# Altium schematic symbol library jlcpcb_2025_04_resistors_extended_1210.schlib: 2670 symbols (part 7 of 14) (continued)
## CR1210F820KP05Z
designator R?  Resistance: 820kΩ  (hidden comment: *)
Resistor, 820kΩ, ±1%, 500mW, 200V, ±100ppm/℃, -55℃~+155℃, SMD 1210; Manufacturer: Uniroyal; Manufacturer Part Number: CR1210F820KP05Z; Supplier 1: LCSC; Supplier Part Number 1: C147169; JLCPCB Part Number: C147169; Power Rating: 500mW; Category: Resistors; Package Size: 1210; JLCPCB Basic Part: Yes; Tolerance: ±1%; Voltage Rating: 200V; Temperature Coefficient: ±100ppm/℃; Temperature Rating: -55℃~+155℃; ComponentLink1Description: Datasheet; ComponentLink1URL: https://wmsc.lcsc.com/wmsc/upload/file/pdf/v2/lcsc/2304140030_Ever-Ohms-Tech-CR1210F820KP05Z_C147169.pdf; ComponentLink2Description: JLCPCB Part URL; ComponentLink2URL: https://jlcpcb.com/partdetail/C147169
pins: 1, 2
1 alternate drawing of the same symbol

## CR1210F820RP05Z
designator R?  Resistance: 820Ω  (hidden comment: *)
Resistor, 820Ω, ±1%, 500mW, 200V, ±100ppm/℃, -55℃~+155℃, SMD 1210; Manufacturer: Uniroyal; Manufacturer Part Number: CR1210F820RP05Z; Supplier 1: LCSC; Supplier Part Number 1: C165422; JLCPCB Part Number: C165422; Power Rating: 500mW; Category: Resistors; Package Size: 1210; JLCPCB Basic Part: Yes; Tolerance: ±1%; Voltage Rating: 200V; Temperature Coefficient: ±100ppm/℃; Temperature Rating: -55℃~+155℃; ComponentLink1Description: Datasheet; ComponentLink1URL: https://wmsc.lcsc.com/wmsc/upload/file/pdf/v2/lcsc/2304140030_Ever-Ohms-Tech-CR1210F820RP05Z_C165422.pdf; ComponentLink2Description: JLCPCB Part URL; ComponentLink2URL: https://jlcpcb.com/partdetail/C165422
pins: 1, 2
1 alternate drawing of the same symbol

## CR1210F909RP05Z
designator R?  Resistance: 909Ω  (hidden comment: *)
Resistor, 909Ω, ±1%, 500mW, 200V, ±100ppm/℃, -55℃~+155℃, SMD 1210; Manufacturer: Uniroyal; Manufacturer Part Number: CR1210F909RP05Z; Supplier 1: LCSC; Supplier Part Number 1: C174488; JLCPCB Part Number: C174488; Power Rating: 500mW; Category: Resistors; Package Size: 1210; JLCPCB Basic Part: Yes; Tolerance: ±1%; Voltage Rating: 200V; Temperature Coefficient: ±100ppm/℃; Temperature Rating: -55℃~+155℃; ComponentLink1Description: Datasheet; ComponentLink1URL: https://wmsc.lcsc.com/wmsc/upload/file/pdf/v2/lcsc/2304140030_Ever-Ohms-Tech-CR1210F909RP05Z_C174488.pdf; ComponentLink2Description: JLCPCB Part URL; ComponentLink2URL: https://jlcpcb.com/partdetail/C174488
pins: 1, 2
1 alternate drawing of the same symbol

## CR1210F31003G
designator R?  Resistance: 100kΩ  (hidden comment: *)
Resistor, 100kΩ, ±1%, 200V, SMD 1210; Manufacturer: Uniroyal; Manufacturer Part Number: CR1210F31003G; Supplier 1: LCSC; Supplier Part Number 1: C3037464; JLCPCB Part Number: C3037464; Category: Resistors; Package Size: 1210; JLCPCB Basic Part: Yes; Tolerance: ±1%; Voltage Rating: 200V; ComponentLink1Description: Datasheet; ComponentLink1URL: https://wmsc.lcsc.com/wmsc/upload/file/pdf/v2/lcsc/2206222045_LIZ-Elec-CR1210F31003G_C3037464.pdf; ComponentLink2Description: JLCPCB Part URL; ComponentLink2URL: https://jlcpcb.com/partdetail/C3037464
pins: 1, 2
1 alternate drawing of the same symbol

## CR1210F31200G
designator R?  Resistance: 120Ω  (hidden comment: *)
Resistor, 120Ω, ±1%, 200V, SMD 1210; Manufacturer: Uniroyal; Manufacturer Part Number: CR1210F31200G; Supplier 1: LCSC; Supplier Part Number 1: C3036982; JLCPCB Part Number: C3036982; Category: Resistors; Package Size: 1210; JLCPCB Basic Part: Yes; Tolerance: ±1%; Voltage Rating: 200V; ComponentLink1Description: Datasheet; ComponentLink1URL: https://wmsc.lcsc.com/wmsc/upload/file/pdf/v2/lcsc/2206222045_LIZ-Elec-CR1210F31200G_C3036982.pdf; ComponentLink2Description: JLCPCB Part URL; ComponentLink2URL: https://jlcpcb.com/partdetail/C3036982
pins: 1, 2
1 alternate drawing of the same symbol

## CR1210F32490G
designator R?  Resistance: 249Ω  (hidden comment: *)
Resistor, 249Ω, ±1%, 200V, SMD 1210; Manufacturer: Uniroyal; Manufacturer Part Number: CR1210F32490G; Supplier 1: LCSC; Supplier Part Number 1: C3036977; JLCPCB Part Number: C3036977; Category: Resistors; Package Size: 1210; JLCPCB Basic Part: Yes; Tolerance: ±1%; Voltage Rating: 200V; ComponentLink1Description: Datasheet; ComponentLink1URL: https://wmsc.lcsc.com/wmsc/upload/file/pdf/v2/lcsc/2206301715_LIZ-Elec-CR1210F32490G_C3036977.pdf; ComponentLink2Description: JLCPCB Part URL; ComponentLink2URL: https://jlcpcb.com/partdetail/C3036977
pins: 1, 2
1 alternate drawing of the same symbol

## CR1210FR040P05Z
designator R?  Resistance: 40mΩ  (hidden comment: *)
Resistor, 40mΩ, ±1%, 500mW, 200V, -55℃~+155℃, SMD 1210; Manufacturer: Uniroyal; Manufacturer Part Number: CR1210FR040P05Z; Supplier 1: LCSC; Supplier Part Number 1: C165440; JLCPCB Part Number: C165440; Power Rating: 500mW; Category: Resistors; Package Size: 1210; JLCPCB Basic Part: Yes; Tolerance: ±1%; Voltage Rating: 200V; Temperature Rating: -55℃~+155℃; ComponentLink1Description: Datasheet; ComponentLink1URL: https://wmsc.lcsc.com/wmsc/upload/file/pdf/v2/lcsc/2304140030_Ever-Ohms-Tech-CR1210FR040P05Z_C165440.pdf; ComponentLink2Description: JLCPCB Part URL; ComponentLink2URL: https://jlcpcb.com/partdetail/C165440
pins: 1, 2
1 alternate drawing of the same symbol

## CR1210FR062P05R
designator R?  Resistance: 62mΩ  (hidden comment: *)
Resistor, 62mΩ, ±1%, 500mW, 200V, -55℃~+155℃, SMD 1210; Manufacturer: Uniroyal; Manufacturer Part Number: CR1210FR062P05R; Supplier 1: LCSC; Supplier Part Number 1: C165439; JLCPCB Part Number: C165439; Power Rating: 500mW; Category: Resistors; Package Size: 1210; JLCPCB Basic Part: Yes; Tolerance: ±1%; Voltage Rating: 200V; Temperature Rating: -55℃~+155℃; ComponentLink1Description: Datasheet; ComponentLink1URL: https://wmsc.lcsc.com/wmsc/upload/file/pdf/v2/lcsc/2304140030_Ever-Ohms-Tech-CR1210FR062P05R_C165439.pdf; ComponentLink2Description: JLCPCB Part URL; ComponentLink2URL: https://jlcpcb.com/partdetail/C165439
pins: 1, 2
1 alternate drawing of the same symbol

## CR1210FR150P05R
designator R?  Resistance: 150mΩ  (hidden comment: *)
Resistor, 150mΩ, ±1%, 500mW, 200V, -55℃~+155℃, SMD 1210; Manufacturer: Uniroyal; Manufacturer Part Number: CR1210FR150P05R; Supplier 1: LCSC; Supplier Part Number 1: C165438; JLCPCB Part Number: C165438; Power Rating: 500mW; Category: Resistors; Package Size: 1210; JLCPCB Basic Part: Yes; Tolerance: ±1%; Voltage Rating: 200V; Temperature Rating: -55℃~+155℃; ComponentLink1Description: Datasheet; ComponentLink1URL: https://wmsc.lcsc.com/wmsc/upload/file/pdf/v2/lcsc/2304140030_Ever-Ohms-Tech-CR1210FR150P05R_C165438.pdf; ComponentLink2Description: JLCPCB Part URL; ComponentLink2URL: https://jlcpcb.com/partdetail/C165438
pins: 1, 2
1 alternate drawing of the same symbol

## CR1210FR430P05R
designator R?  Resistance: 430mΩ  (hidden comment: *)
Resistor, 430mΩ, ±1%, 500mW, 200V, -55℃~+155℃, SMD 1210; Manufacturer: Uniroyal; Manufacturer Part Number: CR1210FR430P05R; Supplier 1: LCSC; Supplier Part Number 1: C165435; JLCPCB Part Number: C165435; Power Rating: 500mW; Category: Resistors; Package Size: 1210; JLCPCB Basic Part: Yes; Tolerance: ±1%; Voltage Rating: 200V; Temperature Rating: -55℃~+155℃; ComponentLink1Description: Datasheet; ComponentLink1URL: https://wmsc.lcsc.com/wmsc/upload/file/pdf/v2/lcsc/2304140030_Ever-Ohms-Tech-CR1210FR430P05R_C165435.pdf; ComponentLink2Description: JLCPCB Part URL; ComponentLink2URL: https://jlcpcb.com/partdetail/C165435
pins: 1, 2
1 alternate drawing of the same symbol

## CR1210FR680P05R
designator R?  Resistance: 680mΩ  (hidden comment: *)
Resistor, 680mΩ, ±1%, 500mW, 200V, -55℃~+155℃, SMD 1210; Manufacturer: Uniroyal; Manufacturer Part Number: CR1210FR680P05R; Supplier 1: LCSC; Supplier Part Number 1: C165433; JLCPCB Part Number: C165433; Power Rating: 500mW; Category: Resistors; Package Size: 1210; JLCPCB Basic Part: Yes; Tolerance: ±1%; Voltage Rating: 200V; Temperature Rating: -55℃~+155℃; ComponentLink1Description: Datasheet; ComponentLink1URL: https://wmsc.lcsc.com/wmsc/upload/file/pdf/v2/lcsc/2304140030_Ever-Ohms-Tech-CR1210FR680P05R_C165433.pdf; ComponentLink2Description: JLCPCB Part URL; ComponentLink2URL: https://jlcpcb.com/partdetail/C165433
pins: 1, 2
1 alternate drawing of the same symbol

## CR1210FR820P05R
designator R?  Resistance: 820mΩ  (hidden comment: *)
Resistor, 820mΩ, ±1%, 500mW, 200V, -55℃~+155℃, SMD 1210; Manufacturer: Uniroyal; Manufacturer Part Number: CR1210FR820P05R; Supplier 1: LCSC; Supplier Part Number 1: C165432; JLCPCB Part Number: C165432; Power Rating: 500mW; Category: Resistors; Package Size: 1210; JLCPCB Basic Part: Yes; Tolerance: ±1%; Voltage Rating: 200V; Temperature Rating: -55℃~+155℃; ComponentLink1Description: Datasheet; ComponentLink1URL: https://wmsc.lcsc.com/wmsc/upload/file/pdf/v2/lcsc/2304140030_Ever-Ohms-Tech-CR1210FR820P05R_C165432.pdf; ComponentLink2Description: JLCPCB Part URL; ComponentLink2URL: https://jlcpcb.com/partdetail/C165432
pins: 1, 2
1 alternate drawing of the same symbol

## CR1210J0R00P05Z
designator R?  Resistance: 0Ω  (hidden comment: *)
Resistor, 0Ω, ±5%, 500mW, 200V, -55℃~+155℃, SMD 1210; Manufacturer: Uniroyal; Manufacturer Part Number: CR1210J0R00P05Z; Supplier 1: LCSC; Supplier Part Number 1: C149726; JLCPCB Part Number: C149726; Power Rating: 500mW; Category: Resistors; Package Size: 1210; JLCPCB Basic Part: Yes; Tolerance: ±5%; Voltage Rating: 200V; Temperature Rating: -55℃~+155℃; ComponentLink1Description: Datasheet; ComponentLink1URL: https://wmsc.lcsc.com/wmsc/upload/file/pdf/v2/lcsc/2304140030_Ever-Ohms-Tech-CR1210J0R00P05Z_C149726.pdf; ComponentLink2Description: JLCPCB Part URL; ComponentLink2URL: https://jlcpcb.com/partdetail/C149726
pins: 1, 2
1 alternate drawing of the same symbol

## CR1210J0R36P05
designator R?  Resistance: 360mΩ  (hidden comment: *)
Resistor, 360mΩ, ±5%, 500mW, 200V, ±600ppm/℃, -55℃~+155℃, SMD 1210; Manufacturer: Uniroyal; Manufacturer Part Number: CR1210J0R36P05; Supplier 1: LCSC; Supplier Part Number 1: C429672; JLCPCB Part Number: C429672; Power Rating: 500mW; Category: Resistors; Package Size: 1210; JLCPCB Basic Part: Yes; Tolerance: ±5%; Voltage Rating: 200V; Temperature Coefficient: ±600ppm/℃; Temperature Rating: -55℃~+155℃; ComponentLink1Description: Datasheet; ComponentLink1URL: https://wmsc.lcsc.com/wmsc/upload/file/pdf/v2/lcsc/2304140030_Ever-Ohms-Tech-CR1210J0R36P05_C429672.pdf; ComponentLink2Description: JLCPCB Part URL; ComponentLink2URL: https://jlcpcb.com/partdetail/C429672
pins: 1, 2
1 alternate drawing of the same symbol

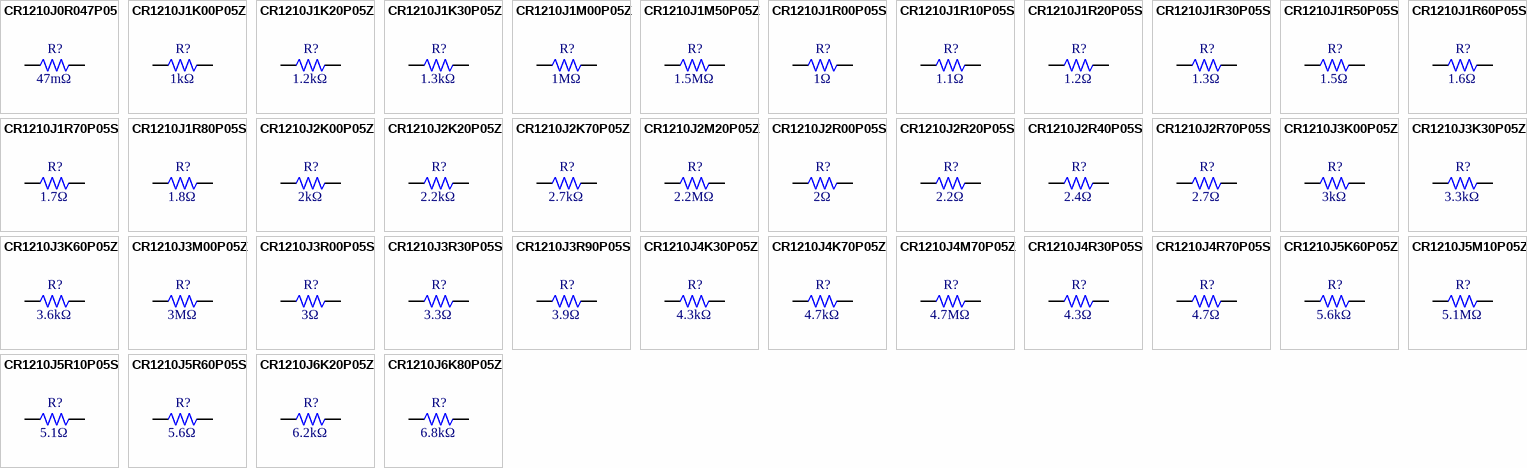
[diagram p33: symbols CR1210J0R047P05 to CR1210J6K80P05Z]

## CR1210J0R047P05
designator R?  Resistance: 47mΩ  (hidden comment: *)
Resistor, 47mΩ, ±5%, 500mW, 200V, -55℃~+155℃, SMD 1210; Manufacturer: Uniroyal; Manufacturer Part Number: CR1210J0R047P05; Supplier 1: LCSC; Supplier Part Number 1: C429545; JLCPCB Part Number: C429545; Power Rating: 500mW; Category: Resistors; Package Size: 1210; JLCPCB Basic Part: Yes; Tolerance: ±5%; Voltage Rating: 200V; Temperature Rating: -55℃~+155℃; ComponentLink1Description: Datasheet; ComponentLink1URL: https://wmsc.lcsc.com/wmsc/upload/file/pdf/v2/lcsc/2304140030_Ever-Ohms-Tech-CR1210J0R047P05_C429545.pdf; ComponentLink2Description: JLCPCB Part URL; ComponentLink2URL: https://jlcpcb.com/partdetail/C429545
pins: 1, 2
1 alternate drawing of the same symbol

## CR1210J1K00P05Z
designator R?  Resistance: 1kΩ  (hidden comment: *)
Resistor, 1kΩ, ±5%, 500mW, 200V, ±100ppm/℃, -55℃~+155℃, SMD 1210; Manufacturer: Uniroyal; Manufacturer Part Number: CR1210J1K00P05Z; Supplier 1: LCSC; Supplier Part Number 1: C149743; JLCPCB Part Number: C149743; Power Rating: 500mW; Category: Resistors; Package Size: 1210; JLCPCB Basic Part: Yes; Tolerance: ±5%; Voltage Rating: 200V; Temperature Coefficient: ±100ppm/℃; Temperature Rating: -55℃~+155℃; ComponentLink1Description: Datasheet; ComponentLink1URL: https://wmsc.lcsc.com/wmsc/upload/file/pdf/v2/lcsc/2304140030_Ever-Ohms-Tech-CR1210J1K00P05Z_C149743.pdf; ComponentLink2Description: JLCPCB Part URL; ComponentLink2URL: https://jlcpcb.com/partdetail/C149743
pins: 1, 2
1 alternate drawing of the same symbol

## CR1210J1K20P05Z
designator R?  Resistance: 1.2kΩ  (hidden comment: *)
Resistor, 1.2kΩ, ±5%, 500mW, 200V, ±100ppm/℃, -55℃~+155℃, SMD 1210; Manufacturer: Uniroyal; Manufacturer Part Number: CR1210J1K20P05Z; Supplier 1: LCSC; Supplier Part Number 1: C149740; JLCPCB Part Number: C149740; Power Rating: 500mW; Category: Resistors; Package Size: 1210; JLCPCB Basic Part: Yes; Tolerance: ±5%; Voltage Rating: 200V; Temperature Coefficient: ±100ppm/℃; Temperature Rating: -55℃~+155℃; ComponentLink1Description: Datasheet; ComponentLink1URL: https://wmsc.lcsc.com/wmsc/upload/file/pdf/v2/lcsc/2304140030_Ever-Ohms-Tech-CR1210J1K20P05Z_C149740.pdf; ComponentLink2Description: JLCPCB Part URL; ComponentLink2URL: https://jlcpcb.com/partdetail/C149740
pins: 1, 2
1 alternate drawing of the same symbol

## CR1210J1K30P05Z
designator R?  Resistance: 1.3kΩ  (hidden comment: *)
Resistor, 1.3kΩ, ±5%, 500mW, 200V, ±100ppm/℃, -55℃~+155℃, SMD 1210; Manufacturer: Uniroyal; Manufacturer Part Number: CR1210J1K30P05Z; Supplier 1: LCSC; Supplier Part Number 1: C174627; JLCPCB Part Number: C174627; Power Rating: 500mW; Category: Resistors; Package Size: 1210; JLCPCB Basic Part: Yes; Tolerance: ±5%; Voltage Rating: 200V; Temperature Coefficient: ±100ppm/℃; Temperature Rating: -55℃~+155℃; ComponentLink1Description: Datasheet; ComponentLink1URL: https://wmsc.lcsc.com/wmsc/upload/file/pdf/v2/lcsc/2304140030_Ever-Ohms-Tech-CR1210J1K30P05Z_C174627.pdf; ComponentLink2Description: JLCPCB Part URL; ComponentLink2URL: https://jlcpcb.com/partdetail/C174627
pins: 1, 2
1 alternate drawing of the same symbol

## CR1210J1M00P05Z
designator R?  Resistance: 1MΩ  (hidden comment: *)
Resistor, 1MΩ, ±5%, 500mW, 200V, ±100ppm/℃, -55℃~+155℃, SMD 1210; Manufacturer: Uniroyal; Manufacturer Part Number: CR1210J1M00P05Z; Supplier 1: LCSC; Supplier Part Number 1: C149747; JLCPCB Part Number: C149747; Power Rating: 500mW; Category: Resistors; Package Size: 1210; JLCPCB Basic Part: Yes; Tolerance: ±5%; Voltage Rating: 200V; Temperature Coefficient: ±100ppm/℃; Temperature Rating: -55℃~+155℃; ComponentLink1Description: Datasheet; ComponentLink1URL: https://wmsc.lcsc.com/wmsc/upload/file/pdf/v2/lcsc/2304140030_Ever-Ohms-Tech-CR1210J1M00P05Z_C149747.pdf; ComponentLink2Description: JLCPCB Part URL; ComponentLink2URL: https://jlcpcb.com/partdetail/C149747
pins: 1, 2
1 alternate drawing of the same symbol

## CR1210J1M50P05Z
designator R?  Resistance: 1.5MΩ  (hidden comment: *)
Resistor, 1.5MΩ, ±5%, 500mW, 200V, ±100ppm/℃, -55℃~+155℃, SMD 1210; Manufacturer: Uniroyal; Manufacturer Part Number: CR1210J1M50P05Z; Supplier 1: LCSC; Supplier Part Number 1: C149745; JLCPCB Part Number: C149745; Power Rating: 500mW; Category: Resistors; Package Size: 1210; JLCPCB Basic Part: Yes; Tolerance: ±5%; Voltage Rating: 200V; Temperature Coefficient: ±100ppm/℃; Temperature Rating: -55℃~+155℃; ComponentLink1Description: Datasheet; ComponentLink1URL: https://wmsc.lcsc.com/wmsc/upload/file/pdf/v2/lcsc/2304140030_Ever-Ohms-Tech-CR1210J1M50P05Z_C149745.pdf; ComponentLink2Description: JLCPCB Part URL; ComponentLink2URL: https://jlcpcb.com/partdetail/C149745
pins: 1, 2
1 alternate drawing of the same symbol

## CR1210J1R00P05S
designator R?  Resistance: 1Ω  (hidden comment: *)
Resistor, 1Ω, ±5%, 500mW, 200V, ±300ppm/℃, -55℃~+155℃, SMD 1210; Manufacturer: Uniroyal; Manufacturer Part Number: CR1210J1R00P05S; Supplier 1: LCSC; Supplier Part Number 1: C429437; JLCPCB Part Number: C429437; Power Rating: 500mW; Category: Resistors; Package Size: 1210; JLCPCB Basic Part: Yes; Tolerance: ±5%; Voltage Rating: 200V; Temperature Coefficient: ±300ppm/℃; Temperature Rating: -55℃~+155℃; ComponentLink1Description: Datasheet; ComponentLink1URL: https://wmsc.lcsc.com/wmsc/upload/file/pdf/v2/lcsc/2304140030_Ever-Ohms-Tech-CR1210J1R00P05S_C429437.pdf; ComponentLink2Description: JLCPCB Part URL; ComponentLink2URL: https://jlcpcb.com/partdetail/C429437
pins: 1, 2
1 alternate drawing of the same symbol

## CR1210J1R10P05S
designator R?  Resistance: 1.1Ω  (hidden comment: *)
Resistor, 1.1Ω, ±5%, 500mW, 200V, ±400ppm/℃, -55℃~+155℃, SMD 1210; Manufacturer: Uniroyal; Manufacturer Part Number: CR1210J1R10P05S; Supplier 1: LCSC; Supplier Part Number 1: C149748; JLCPCB Part Number: C149748; Power Rating: 500mW; Category: Resistors; Package Size: 1210; JLCPCB Basic Part: Yes; Tolerance: ±5%; Voltage Rating: 200V; Temperature Coefficient: ±400ppm/℃; Temperature Rating: -55℃~+155℃; ComponentLink1Description: Datasheet; ComponentLink1URL: https://wmsc.lcsc.com/wmsc/upload/file/pdf/v2/lcsc/2304140030_Ever-Ohms-Tech-CR1210J1R10P05S_C149748.pdf; ComponentLink2Description: JLCPCB Part URL; ComponentLink2URL: https://jlcpcb.com/partdetail/C149748
pins: 1, 2
1 alternate drawing of the same symbol

## CR1210J1R20P05S
designator R?  Resistance: 1.2Ω  (hidden comment: *)
Resistor, 1.2Ω, ±5%, 500mW, 200V, ±400ppm/℃, -55℃~+155℃, SMD 1210; Manufacturer: Uniroyal; Manufacturer Part Number: CR1210J1R20P05S; Supplier 1: LCSC; Supplier Part Number 1: C174569; JLCPCB Part Number: C174569; Power Rating: 500mW; Category: Resistors; Package Size: 1210; JLCPCB Basic Part: Yes; Tolerance: ±5%; Voltage Rating: 200V; Temperature Coefficient: ±400ppm/℃; Temperature Rating: -55℃~+155℃; ComponentLink1Description: Datasheet; ComponentLink1URL: https://wmsc.lcsc.com/wmsc/upload/file/pdf/v2/lcsc/2304140030_Ever-Ohms-Tech-CR1210J1R20P05S_C174569.pdf; ComponentLink2Description: JLCPCB Part URL; ComponentLink2URL: https://jlcpcb.com/partdetail/C174569
pins: 1, 2
1 alternate drawing of the same symbol

## CR1210J1R30P05S
designator R?  Resistance: 1.3Ω  (hidden comment: *)
Resistor, 1.3Ω, ±5%, 500mW, 200V, ±400ppm/℃, -55℃~+155℃, SMD 1210; Manufacturer: Uniroyal; Manufacturer Part Number: CR1210J1R30P05S; Supplier 1: LCSC; Supplier Part Number 1: C174570; JLCPCB Part Number: C174570; Power Rating: 500mW; Category: Resistors; Package Size: 1210; JLCPCB Basic Part: Yes; Tolerance: ±5%; Voltage Rating: 200V; Temperature Coefficient: ±400ppm/℃; Temperature Rating: -55℃~+155℃; ComponentLink1Description: Datasheet; ComponentLink1URL: https://wmsc.lcsc.com/wmsc/upload/file/pdf/v2/lcsc/2304140030_Ever-Ohms-Tech-CR1210J1R30P05S_C174570.pdf; ComponentLink2Description: JLCPCB Part URL; ComponentLink2URL: https://jlcpcb.com/partdetail/C174570
pins: 1, 2
1 alternate drawing of the same symbol

## CR1210J1R50P05S
designator R?  Resistance: 1.5Ω  (hidden comment: *)
Resistor, 1.5Ω, ±5%, 500mW, 200V, ±400ppm/℃, -55℃~+155℃, SMD 1210; Manufacturer: Uniroyal; Manufacturer Part Number: CR1210J1R50P05S; Supplier 1: LCSC; Supplier Part Number 1: C149749; JLCPCB Part Number: C149749; Power Rating: 500mW; Category: Resistors; Package Size: 1210; JLCPCB Basic Part: Yes; Tolerance: ±5%; Voltage Rating: 200V; Temperature Coefficient: ±400ppm/℃; Temperature Rating: -55℃~+155℃; ComponentLink1Description: Datasheet; ComponentLink1URL: https://wmsc.lcsc.com/wmsc/upload/file/pdf/v2/lcsc/2304140030_Ever-Ohms-Tech-CR1210J1R50P05S_C149749.pdf; ComponentLink2Description: JLCPCB Part URL; ComponentLink2URL: https://jlcpcb.com/partdetail/C149749
pins: 1, 2
1 alternate drawing of the same symbol

## CR1210J1R60P05S
designator R?  Resistance: 1.6Ω  (hidden comment: *)
Resistor, 1.6Ω, ±5%, 500mW, 200V, ±400ppm/℃, -55℃~+155℃, SMD 1210; Manufacturer: Uniroyal; Manufacturer Part Number: CR1210J1R60P05S; Supplier 1: LCSC; Supplier Part Number 1: C174571; JLCPCB Part Number: C174571; Power Rating: 500mW; Category: Resistors; Package Size: 1210; JLCPCB Basic Part: Yes; Tolerance: ±5%; Voltage Rating: 200V; Temperature Coefficient: ±400ppm/℃; Temperature Rating: -55℃~+155℃; ComponentLink1Description: Datasheet; ComponentLink1URL: https://wmsc.lcsc.com/wmsc/upload/file/pdf/v2/lcsc/2304140030_Ever-Ohms-Tech-CR1210J1R60P05S_C174571.pdf; ComponentLink2Description: JLCPCB Part URL; ComponentLink2URL: https://jlcpcb.com/partdetail/C174571
pins: 1, 2
1 alternate drawing of the same symbol

## CR1210J1R70P05S
designator R?  Resistance: 1.7Ω  (hidden comment: *)
Resistor, 1.7Ω, ±5%, 500mW, 200V, ±400ppm/℃, -55℃~+155℃, SMD 1210; Manufacturer: Uniroyal; Manufacturer Part Number: CR1210J1R70P05S; Supplier 1: LCSC; Supplier Part Number 1: C174572; JLCPCB Part Number: C174572; Power Rating: 500mW; Category: Resistors; Package Size: 1210; JLCPCB Basic Part: Yes; Tolerance: ±5%; Voltage Rating: 200V; Temperature Coefficient: ±400ppm/℃; Temperature Rating: -55℃~+155℃; ComponentLink1Description: Datasheet; ComponentLink1URL: https://wmsc.lcsc.com/wmsc/upload/file/pdf/v2/lcsc/2304140030_Ever-Ohms-Tech-CR1210J1R70P05S_C174572.pdf; ComponentLink2Description: JLCPCB Part URL; ComponentLink2URL: https://jlcpcb.com/partdetail/C174572
pins: 1, 2
1 alternate drawing of the same symbol

## CR1210J1R80P05S
designator R?  Resistance: 1.8Ω  (hidden comment: *)
Resistor, 1.8Ω, ±5%, 500mW, 200V, ±400ppm/℃, -55℃~+155℃, SMD 1210; Manufacturer: Uniroyal; Manufacturer Part Number: CR1210J1R80P05S; Supplier 1: LCSC; Supplier Part Number 1: C149750; JLCPCB Part Number: C149750; Power Rating: 500mW; Category: Resistors; Package Size: 1210; JLCPCB Basic Part: Yes; Tolerance: ±5%; Voltage Rating: 200V; Temperature Coefficient: ±400ppm/℃; Temperature Rating: -55℃~+155℃; ComponentLink1Description: Datasheet; ComponentLink1URL: https://wmsc.lcsc.com/wmsc/upload/file/pdf/v2/lcsc/2304140030_Ever-Ohms-Tech-CR1210J1R80P05S_C149750.pdf; ComponentLink2Description: JLCPCB Part URL; ComponentLink2URL: https://jlcpcb.com/partdetail/C149750
pins: 1, 2
1 alternate drawing of the same symbol

## CR1210J2K00P05Z
designator R?  Resistance: 2kΩ  (hidden comment: *)
Resistor, 2kΩ, ±5%, 500mW, 200V, ±100ppm/℃, -55℃~+155℃, SMD 1210; Manufacturer: Uniroyal; Manufacturer Part Number: CR1210J2K00P05Z; Supplier 1: LCSC; Supplier Part Number 1: C149764; JLCPCB Part Number: C149764; Power Rating: 500mW; Category: Resistors; Package Size: 1210; JLCPCB Basic Part: Yes; Tolerance: ±5%; Voltage Rating: 200V; Temperature Coefficient: ±100ppm/℃; Temperature Rating: -55℃~+155℃; ComponentLink1Description: Datasheet; ComponentLink1URL: https://wmsc.lcsc.com/wmsc/upload/file/pdf/v2/lcsc/2304140030_Ever-Ohms-Tech-CR1210J2K00P05Z_C149764.pdf; ComponentLink2Description: JLCPCB Part URL; ComponentLink2URL: https://jlcpcb.com/partdetail/C149764
pins: 1, 2
1 alternate drawing of the same symbol

## CR1210J2K20P05Z
designator R?  Resistance: 2.2kΩ  (hidden comment: *)
Resistor, 2.2kΩ, ±5%, 500mW, 200V, ±100ppm/℃, -55℃~+155℃, SMD 1210; Manufacturer: Uniroyal; Manufacturer Part Number: CR1210J2K20P05Z; Supplier 1: LCSC; Supplier Part Number 1: C149762; JLCPCB Part Number: C149762; Power Rating: 500mW; Category: Resistors; Package Size: 1210; JLCPCB Basic Part: Yes; Tolerance: ±5%; Voltage Rating: 200V; Temperature Coefficient: ±100ppm/℃; Temperature Rating: -55℃~+155℃; ComponentLink1Description: Datasheet; ComponentLink1URL: https://wmsc.lcsc.com/wmsc/upload/file/pdf/v2/lcsc/2304140030_Ever-Ohms-Tech-CR1210J2K20P05Z_C149762.pdf; ComponentLink2Description: JLCPCB Part URL; ComponentLink2URL: https://jlcpcb.com/partdetail/C149762
pins: 1, 2
1 alternate drawing of the same symbol

## CR1210J2K70P05Z
designator R?  Resistance: 2.7kΩ  (hidden comment: *)
Resistor, 2.7kΩ, ±5%, 500mW, 200V, ±100ppm/℃, -55℃~+155℃, SMD 1210; Manufacturer: Uniroyal; Manufacturer Part Number: CR1210J2K70P05Z; Supplier 1: LCSC; Supplier Part Number 1: C149763; JLCPCB Part Number: C149763; Power Rating: 500mW; Category: Resistors; Package Size: 1210; JLCPCB Basic Part: Yes; Tolerance: ±5%; Voltage Rating: 200V; Temperature Coefficient: ±100ppm/℃; Temperature Rating: -55℃~+155℃; ComponentLink1Description: Datasheet; ComponentLink1URL: https://wmsc.lcsc.com/wmsc/upload/file/pdf/v2/lcsc/2304140030_Ever-Ohms-Tech-CR1210J2K70P05Z_C149763.pdf; ComponentLink2Description: JLCPCB Part URL; ComponentLink2URL: https://jlcpcb.com/partdetail/C149763
pins: 1, 2
1 alternate drawing of the same symbol

## CR1210J2M20P05Z
designator R?  Resistance: 2.2MΩ  (hidden comment: *)
Resistor, 2.2MΩ, ±5%, 500mW, 200V, ±100ppm/℃, -55℃~+155℃, SMD 1210; Manufacturer: Uniroyal; Manufacturer Part Number: CR1210J2M20P05Z; Supplier 1: LCSC; Supplier Part Number 1: C149765; JLCPCB Part Number: C149765; Power Rating: 500mW; Category: Resistors; Package Size: 1210; JLCPCB Basic Part: Yes; Tolerance: ±5%; Voltage Rating: 200V; Temperature Coefficient: ±100ppm/℃; Temperature Rating: -55℃~+155℃; ComponentLink1Description: Datasheet; ComponentLink1URL: https://wmsc.lcsc.com/wmsc/upload/file/pdf/v2/lcsc/2304140030_Ever-Ohms-Tech-CR1210J2M20P05Z_C149765.pdf; ComponentLink2Description: JLCPCB Part URL; ComponentLink2URL: https://jlcpcb.com/partdetail/C149765
pins: 1, 2
1 alternate drawing of the same symbol

## CR1210J2R00P05S
designator R?  Resistance: 2Ω  (hidden comment: *)
Resistor, 2Ω, ±5%, 500mW, 200V, ±400ppm/℃, -55℃~+155℃, SMD 1210; Manufacturer: Uniroyal; Manufacturer Part Number: CR1210J2R00P05S; Supplier 1: LCSC; Supplier Part Number 1: C174574; JLCPCB Part Number: C174574; Power Rating: 500mW; Category: Resistors; Package Size: 1210; JLCPCB Basic Part: Yes; Tolerance: ±5%; Voltage Rating: 200V; Temperature Coefficient: ±400ppm/℃; Temperature Rating: -55℃~+155℃; ComponentLink1Description: Datasheet; ComponentLink1URL: https://wmsc.lcsc.com/wmsc/upload/file/pdf/v2/lcsc/2304140030_Ever-Ohms-Tech-CR1210J2R00P05S_C174574.pdf; ComponentLink2Description: JLCPCB Part URL; ComponentLink2URL: https://jlcpcb.com/partdetail/C174574
pins: 1, 2
1 alternate drawing of the same symbol

## CR1210J2R20P05S
designator R?  Resistance: 2.2Ω  (hidden comment: *)
Resistor, 2.2Ω, ±5%, 500mW, 200V, ±400ppm/℃, -55℃~+155℃, SMD 1210; Manufacturer: Uniroyal; Manufacturer Part Number: CR1210J2R20P05S; Supplier 1: LCSC; Supplier Part Number 1: C149767; JLCPCB Part Number: C149767; Power Rating: 500mW; Category: Resistors; Package Size: 1210; JLCPCB Basic Part: Yes; Tolerance: ±5%; Voltage Rating: 200V; Temperature Coefficient: ±400ppm/℃; Temperature Rating: -55℃~+155℃; ComponentLink1Description: Datasheet; ComponentLink1URL: https://wmsc.lcsc.com/wmsc/upload/file/pdf/v2/lcsc/2304140030_Ever-Ohms-Tech-CR1210J2R20P05S_C149767.pdf; ComponentLink2Description: JLCPCB Part URL; ComponentLink2URL: https://jlcpcb.com/partdetail/C149767
pins: 1, 2
1 alternate drawing of the same symbol

## CR1210J2R40P05S
designator R?  Resistance: 2.4Ω  (hidden comment: *)
Resistor, 2.4Ω, ±5%, 500mW, 200V, ±400ppm/℃, -55℃~+155℃, SMD 1210; Manufacturer: Uniroyal; Manufacturer Part Number: CR1210J2R40P05S; Supplier 1: LCSC; Supplier Part Number 1: C174575; JLCPCB Part Number: C174575; Power Rating: 500mW; Category: Resistors; Package Size: 1210; JLCPCB Basic Part: Yes; Tolerance: ±5%; Voltage Rating: 200V; Temperature Coefficient: ±400ppm/℃; Temperature Rating: -55℃~+155℃; ComponentLink1Description: Datasheet; ComponentLink1URL: https://wmsc.lcsc.com/wmsc/upload/file/pdf/v2/lcsc/2304140030_Ever-Ohms-Tech-CR1210J2R40P05S_C174575.pdf; ComponentLink2Description: JLCPCB Part URL; ComponentLink2URL: https://jlcpcb.com/partdetail/C174575
pins: 1, 2
1 alternate drawing of the same symbol

## CR1210J2R70P05S
designator R?  Resistance: 2.7Ω  (hidden comment: *)
Resistor, 2.7Ω, ±5%, 500mW, 200V, ±400ppm/℃, -55℃~+155℃, SMD 1210; Manufacturer: Uniroyal; Manufacturer Part Number: CR1210J2R70P05S; Supplier 1: LCSC; Supplier Part Number 1: C149768; JLCPCB Part Number: C149768; Power Rating: 500mW; Category: Resistors; Package Size: 1210; JLCPCB Basic Part: Yes; Tolerance: ±5%; Voltage Rating: 200V; Temperature Coefficient: ±400ppm/℃; Temperature Rating: -55℃~+155℃; ComponentLink1Description: Datasheet; ComponentLink1URL: https://wmsc.lcsc.com/wmsc/upload/file/pdf/v2/lcsc/2304140030_Ever-Ohms-Tech-CR1210J2R70P05S_C149768.pdf; ComponentLink2Description: JLCPCB Part URL; ComponentLink2URL: https://jlcpcb.com/partdetail/C149768
pins: 1, 2
1 alternate drawing of the same symbol

## CR1210J3K00P05Z
designator R?  Resistance: 3kΩ  (hidden comment: *)
Resistor, 3kΩ, ±5%, 500mW, 200V, ±100ppm/℃, -55℃~+155℃, SMD 1210; Manufacturer: Uniroyal; Manufacturer Part Number: CR1210J3K00P05Z; Supplier 1: LCSC; Supplier Part Number 1: C174632; JLCPCB Part Number: C174632; Power Rating: 500mW; Category: Resistors; Package Size: 1210; JLCPCB Basic Part: Yes; Tolerance: ±5%; Voltage Rating: 200V; Temperature Coefficient: ±100ppm/℃; Temperature Rating: -55℃~+155℃; ComponentLink1Description: Datasheet; ComponentLink1URL: https://wmsc.lcsc.com/wmsc/upload/file/pdf/v2/lcsc/2304140030_Ever-Ohms-Tech-CR1210J3K00P05Z_C174632.pdf; ComponentLink2Description: JLCPCB Part URL; ComponentLink2URL: https://jlcpcb.com/partdetail/C174632
pins: 1, 2
1 alternate drawing of the same symbol

## CR1210J3K30P05Z
designator R?  Resistance: 3.3kΩ  (hidden comment: *)
Resistor, 3.3kΩ, ±5%, 500mW, 200V, ±100ppm/℃, -55℃~+155℃, SMD 1210; Manufacturer: Uniroyal; Manufacturer Part Number: CR1210J3K30P05Z; Supplier 1: LCSC; Supplier Part Number 1: C149780; JLCPCB Part Number: C149780; Power Rating: 500mW; Category: Resistors; Package Size: 1210; JLCPCB Basic Part: Yes; Tolerance: ±5%; Voltage Rating: 200V; Temperature Coefficient: ±100ppm/℃; Temperature Rating: -55℃~+155℃; ComponentLink1Description: Datasheet; ComponentLink1URL: https://wmsc.lcsc.com/wmsc/upload/file/pdf/v2/lcsc/2304140030_Ever-Ohms-Tech-CR1210J3K30P05Z_C149780.pdf; ComponentLink2Description: JLCPCB Part URL; ComponentLink2URL: https://jlcpcb.com/partdetail/C149780
pins: 1, 2
1 alternate drawing of the same symbol

## CR1210J3K60P05Z
designator R?  Resistance: 3.6kΩ  (hidden comment: *)
Resistor, 3.6kΩ, ±5%, 500mW, 200V, ±100ppm/℃, -55℃~+155℃, SMD 1210; Manufacturer: Uniroyal; Manufacturer Part Number: CR1210J3K60P05Z; Supplier 1: LCSC; Supplier Part Number 1: C174633; JLCPCB Part Number: C174633; Power Rating: 500mW; Category: Resistors; Package Size: 1210; JLCPCB Basic Part: Yes; Tolerance: ±5%; Voltage Rating: 200V; Temperature Coefficient: ±100ppm/℃; Temperature Rating: -55℃~+155℃; ComponentLink1Description: Datasheet; ComponentLink1URL: https://wmsc.lcsc.com/wmsc/upload/file/pdf/v2/lcsc/2304140030_Ever-Ohms-Tech-CR1210J3K60P05Z_C174633.pdf; ComponentLink2Description: JLCPCB Part URL; ComponentLink2URL: https://jlcpcb.com/partdetail/C174633
pins: 1, 2
1 alternate drawing of the same symbol

## CR1210J3M00P05Z
designator R?  Resistance: 3MΩ  (hidden comment: *)
Resistor, 3MΩ, ±5%, 500mW, 200V, ±200ppm/℃, -55℃~+155℃, SMD 1210; Manufacturer: Uniroyal; Manufacturer Part Number: CR1210J3M00P05Z; Supplier 1: LCSC; Supplier Part Number 1: C429249; JLCPCB Part Number: C429249; Power Rating: 500mW; Category: Resistors; Package Size: 1210; JLCPCB Basic Part: Yes; Tolerance: ±5%; Voltage Rating: 200V; Temperature Coefficient: ±200ppm/℃; Temperature Rating: -55℃~+155℃; ComponentLink1Description: Datasheet; ComponentLink1URL: https://wmsc.lcsc.com/wmsc/upload/file/pdf/v2/lcsc/2304140030_Ever-Ohms-Tech-CR1210J3M00P05Z_C429249.pdf; ComponentLink2Description: JLCPCB Part URL; ComponentLink2URL: https://jlcpcb.com/partdetail/C429249
pins: 1, 2
1 alternate drawing of the same symbol

## CR1210J3R00P05S
designator R?  Resistance: 3Ω  (hidden comment: *)
Resistor, 3Ω, ±5%, 500mW, 200V, ±400ppm/℃, -55℃~+155℃, SMD 1210; Manufacturer: Uniroyal; Manufacturer Part Number: CR1210J3R00P05S; Supplier 1: LCSC; Supplier Part Number 1: C149786; JLCPCB Part Number: C149786; Power Rating: 500mW; Category: Resistors; Package Size: 1210; JLCPCB Basic Part: Yes; Tolerance: ±5%; Voltage Rating: 200V; Temperature Coefficient: ±400ppm/℃; Temperature Rating: -55℃~+155℃; ComponentLink1Description: Datasheet; ComponentLink1URL: https://wmsc.lcsc.com/wmsc/upload/file/pdf/v2/lcsc/2304140030_Ever-Ohms-Tech-CR1210J3R00P05S_C149786.pdf; ComponentLink2Description: JLCPCB Part URL; ComponentLink2URL: https://jlcpcb.com/partdetail/C149786
pins: 1, 2
1 alternate drawing of the same symbol

## CR1210J3R30P05S
designator R?  Resistance: 3.3Ω  (hidden comment: *)
Resistor, 3.3Ω, ±5%, 500mW, 200V, ±400ppm/℃, -55℃~+155℃, SMD 1210; Manufacturer: Uniroyal; Manufacturer Part Number: CR1210J3R30P05S; Supplier 1: LCSC; Supplier Part Number 1: C149784; JLCPCB Part Number: C149784; Power Rating: 500mW; Category: Resistors; Package Size: 1210; JLCPCB Basic Part: Yes; Tolerance: ±5%; Voltage Rating: 200V; Temperature Coefficient: ±400ppm/℃; Temperature Rating: -55℃~+155℃; ComponentLink1Description: Datasheet; ComponentLink1URL: https://wmsc.lcsc.com/wmsc/upload/file/pdf/v2/lcsc/2304140030_Ever-Ohms-Tech-CR1210J3R30P05S_C149784.pdf; ComponentLink2Description: JLCPCB Part URL; ComponentLink2URL: https://jlcpcb.com/partdetail/C149784
pins: 1, 2
1 alternate drawing of the same symbol

## CR1210J3R90P05S
designator R?  Resistance: 3.9Ω  (hidden comment: *)
Resistor, 3.9Ω, ±5%, 500mW, 200V, ±400ppm/℃, -55℃~+155℃, SMD 1210; Manufacturer: Uniroyal; Manufacturer Part Number: CR1210J3R90P05S; Supplier 1: LCSC; Supplier Part Number 1: C149785; JLCPCB Part Number: C149785; Power Rating: 500mW; Category: Resistors; Package Size: 1210; JLCPCB Basic Part: Yes; Tolerance: ±5%; Voltage Rating: 200V; Temperature Coefficient: ±400ppm/℃; Temperature Rating: -55℃~+155℃; ComponentLink1Description: Datasheet; ComponentLink1URL: https://wmsc.lcsc.com/wmsc/upload/file/pdf/v2/lcsc/2304140030_Ever-Ohms-Tech-CR1210J3R90P05S_C149785.pdf; ComponentLink2Description: JLCPCB Part URL; ComponentLink2URL: https://jlcpcb.com/partdetail/C149785
pins: 1, 2
1 alternate drawing of the same symbol

## CR1210J4K30P05Z
designator R?  Resistance: 4.3kΩ  (hidden comment: *)
Resistor, 4.3kΩ, ±5%, 500mW, 200V, ±100ppm/℃, -55℃~+155℃, SMD 1210; Manufacturer: Uniroyal; Manufacturer Part Number: CR1210J4K30P05Z; Supplier 1: LCSC; Supplier Part Number 1: C174634; JLCPCB Part Number: C174634; Power Rating: 500mW; Category: Resistors; Package Size: 1210; JLCPCB Basic Part: Yes; Tolerance: ±5%; Voltage Rating: 200V; Temperature Coefficient: ±100ppm/℃; Temperature Rating: -55℃~+155℃; ComponentLink1Description: Datasheet; ComponentLink1URL: https://wmsc.lcsc.com/wmsc/upload/file/pdf/v2/lcsc/2304140030_Ever-Ohms-Tech-CR1210J4K30P05Z_C174634.pdf; ComponentLink2Description: JLCPCB Part URL; ComponentLink2URL: https://jlcpcb.com/partdetail/C174634
pins: 1, 2
1 alternate drawing of the same symbol

## CR1210J4K70P05Z
designator R?  Resistance: 4.7kΩ  (hidden comment: *)
Resistor, 4.7kΩ, ±5%, 500mW, 200V, ±100ppm/℃, -55℃~+155℃, SMD 1210; Manufacturer: Uniroyal; Manufacturer Part Number: CR1210J4K70P05Z; Supplier 1: LCSC; Supplier Part Number 1: C149790; JLCPCB Part Number: C149790; Power Rating: 500mW; Category: Resistors; Package Size: 1210; JLCPCB Basic Part: Yes; Tolerance: ±5%; Voltage Rating: 200V; Temperature Coefficient: ±100ppm/℃; Temperature Rating: -55℃~+155℃; ComponentLink1Description: Datasheet; ComponentLink1URL: https://wmsc.lcsc.com/wmsc/upload/file/pdf/v2/lcsc/2304140030_Ever-Ohms-Tech-CR1210J4K70P05Z_C149790.pdf; ComponentLink2Description: JLCPCB Part URL; ComponentLink2URL: https://jlcpcb.com/partdetail/C149790
pins: 1, 2
1 alternate drawing of the same symbol

## CR1210J4M70P05Z
designator R?  Resistance: 4.7MΩ  (hidden comment: *)
Resistor, 4.7MΩ, ±5%, 500mW, 200V, ±100ppm/℃, -55℃~+155℃, SMD 1210; Manufacturer: Uniroyal; Manufacturer Part Number: CR1210J4M70P05Z; Supplier 1: LCSC; Supplier Part Number 1: C149791; JLCPCB Part Number: C149791; Power Rating: 500mW; Category: Resistors; Package Size: 1210; JLCPCB Basic Part: Yes; Tolerance: ±5%; Voltage Rating: 200V; Temperature Coefficient: ±100ppm/℃; Temperature Rating: -55℃~+155℃; ComponentLink1Description: Datasheet; ComponentLink1URL: https://wmsc.lcsc.com/wmsc/upload/file/pdf/v2/lcsc/2304140030_Ever-Ohms-Tech-CR1210J4M70P05Z_C149791.pdf; ComponentLink2Description: JLCPCB Part URL; ComponentLink2URL: https://jlcpcb.com/partdetail/C149791
pins: 1, 2
1 alternate drawing of the same symbol

## CR1210J4R30P05S
designator R?  Resistance: 4.3Ω  (hidden comment: *)
Resistor, 4.3Ω, ±5%, 500mW, 200V, ±400ppm/℃, -55℃~+155℃, SMD 1210; Manufacturer: Uniroyal; Manufacturer Part Number: CR1210J4R30P05S; Supplier 1: LCSC; Supplier Part Number 1: C174578; JLCPCB Part Number: C174578; Power Rating: 500mW; Category: Resistors; Package Size: 1210; JLCPCB Basic Part: Yes; Tolerance: ±5%; Voltage Rating: 200V; Temperature Coefficient: ±400ppm/℃; Temperature Rating: -55℃~+155℃; ComponentLink1Description: Datasheet; ComponentLink1URL: https://wmsc.lcsc.com/wmsc/upload/file/pdf/v2/lcsc/2304140030_Ever-Ohms-Tech-CR1210J4R30P05S_C174578.pdf; ComponentLink2Description: JLCPCB Part URL; ComponentLink2URL: https://jlcpcb.com/partdetail/C174578
pins: 1, 2
1 alternate drawing of the same symbol

## CR1210J4R70P05S
designator R?  Resistance: 4.7Ω  (hidden comment: *)
Resistor, 4.7Ω, ±5%, 500mW, 200V, ±400ppm/℃, -55℃~+155℃, SMD 1210; Manufacturer: Uniroyal; Manufacturer Part Number: CR1210J4R70P05S; Supplier 1: LCSC; Supplier Part Number 1: C174579; JLCPCB Part Number: C174579; Power Rating: 500mW; Category: Resistors; Package Size: 1210; JLCPCB Basic Part: Yes; Tolerance: ±5%; Voltage Rating: 200V; Temperature Coefficient: ±400ppm/℃; Temperature Rating: -55℃~+155℃; ComponentLink1Description: Datasheet; ComponentLink1URL: https://wmsc.lcsc.com/wmsc/upload/file/pdf/v2/lcsc/2304140030_Ever-Ohms-Tech-CR1210J4R70P05S_C174579.pdf; ComponentLink2Description: JLCPCB Part URL; ComponentLink2URL: https://jlcpcb.com/partdetail/C174579
pins: 1, 2
1 alternate drawing of the same symbol

## CR1210J5K60P05Z
designator R?  Resistance: 5.6kΩ  (hidden comment: *)
Resistor, 5.6kΩ, ±5%, 500mW, 200V, ±100ppm/℃, -55℃~+155℃, SMD 1210; Manufacturer: Uniroyal; Manufacturer Part Number: CR1210J5K60P05Z; Supplier 1: LCSC; Supplier Part Number 1: C174636; JLCPCB Part Number: C174636; Power Rating: 500mW; Category: Resistors; Package Size: 1210; JLCPCB Basic Part: Yes; Tolerance: ±5%; Voltage Rating: 200V; Temperature Coefficient: ±100ppm/℃; Temperature Rating: -55℃~+155℃; ComponentLink1Description: Datasheet; ComponentLink1URL: https://wmsc.lcsc.com/wmsc/upload/file/pdf/v2/lcsc/2304140030_Ever-Ohms-Tech-CR1210J5K60P05Z_C174636.pdf; ComponentLink2Description: JLCPCB Part URL; ComponentLink2URL: https://jlcpcb.com/partdetail/C174636
pins: 1, 2
1 alternate drawing of the same symbol

## CR1210J5M10P05Z
designator R?  Resistance: 5.1MΩ  (hidden comment: *)
Resistor, 5.1MΩ, ±5%, 500mW, 200V, ±100ppm/℃, -55℃~+155℃, SMD 1210; Manufacturer: Uniroyal; Manufacturer Part Number: CR1210J5M10P05Z; Supplier 1: LCSC; Supplier Part Number 1: C174676; JLCPCB Part Number: C174676; Power Rating: 500mW; Category: Resistors; Package Size: 1210; JLCPCB Basic Part: Yes; Tolerance: ±5%; Voltage Rating: 200V; Temperature Coefficient: ±100ppm/℃; Temperature Rating: -55℃~+155℃; ComponentLink1Description: Datasheet; ComponentLink1URL: https://wmsc.lcsc.com/wmsc/upload/file/pdf/v2/lcsc/2304140030_Ever-Ohms-Tech-CR1210J5M10P05Z_C174676.pdf; ComponentLink2Description: JLCPCB Part URL; ComponentLink2URL: https://jlcpcb.com/partdetail/C174676
pins: 1, 2
1 alternate drawing of the same symbol

## CR1210J5R10P05S
designator R?  Resistance: 5.1Ω  (hidden comment: *)
Resistor, 5.1Ω, ±5%, 500mW, 200V, ±400ppm/℃, -55℃~+155℃, SMD 1210; Manufacturer: Uniroyal; Manufacturer Part Number: CR1210J5R10P05S; Supplier 1: LCSC; Supplier Part Number 1: C174581; JLCPCB Part Number: C174581; Power Rating: 500mW; Category: Resistors; Package Size: 1210; JLCPCB Basic Part: Yes; Tolerance: ±5%; Voltage Rating: 200V; Temperature Coefficient: ±400ppm/℃; Temperature Rating: -55℃~+155℃; ComponentLink1Description: Datasheet; ComponentLink1URL: https://wmsc.lcsc.com/wmsc/upload/file/pdf/v2/lcsc/2304140030_Ever-Ohms-Tech-CR1210J5R10P05S_C174581.pdf; ComponentLink2Description: JLCPCB Part URL; ComponentLink2URL: https://jlcpcb.com/partdetail/C174581
pins: 1, 2
1 alternate drawing of the same symbol

## CR1210J5R60P05S
designator R?  Resistance: 5.6Ω  (hidden comment: *)
Resistor, 5.6Ω, ±5%, 500mW, 200V, ±400ppm/℃, -55℃~+155℃, SMD 1210; Manufacturer: Uniroyal; Manufacturer Part Number: CR1210J5R60P05S; Supplier 1: LCSC; Supplier Part Number 1: C174582; JLCPCB Part Number: C174582; Power Rating: 500mW; Category: Resistors; Package Size: 1210; JLCPCB Basic Part: Yes; Tolerance: ±5%; Voltage Rating: 200V; Temperature Coefficient: ±400ppm/℃; Temperature Rating: -55℃~+155℃; ComponentLink1Description: Datasheet; ComponentLink1URL: https://wmsc.lcsc.com/wmsc/upload/file/pdf/v2/lcsc/2304140030_Ever-Ohms-Tech-CR1210J5R60P05S_C174582.pdf; ComponentLink2Description: JLCPCB Part URL; ComponentLink2URL: https://jlcpcb.com/partdetail/C174582
pins: 1, 2
1 alternate drawing of the same symbol